# Altium footprint library Intelliclone.PcbLib: 372 footprints (part 18 of 24)
Each footprint in its own frame and in the unit in brackets; x right, y up, seen from the top. Pads: shape width x height; smd on the part's side, far side on the other; paste and mask are expansions set on the pad; w line width, h text height; cw(c..) or ccw(c..) is an arc to the next point about the centre after c.
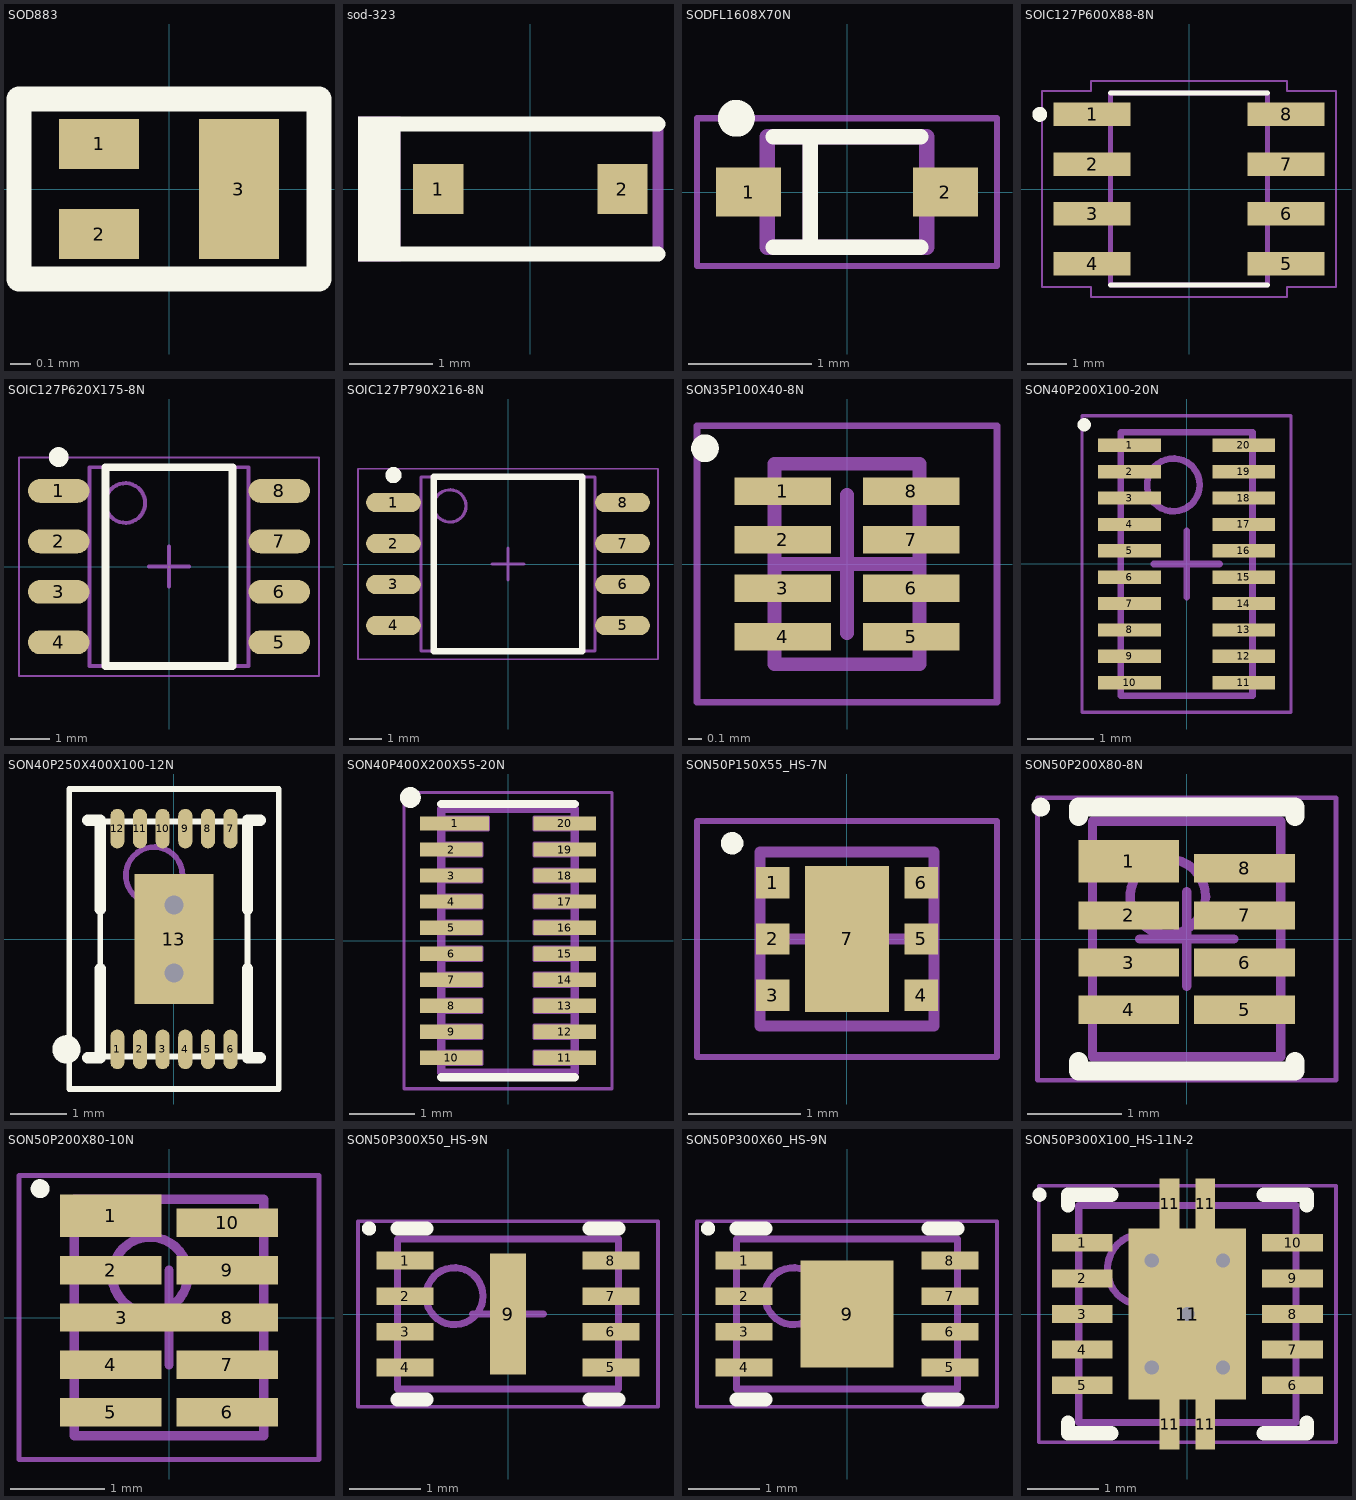
[diagram p17: the footprints below, top view; thin cyan lines are the x and y axes]

## SOD883 [mm]
pads (3):
  rect 0.4x0.25 smd paste+0 mask+0.05: 1(-0.35,0.225) 2(-0.35,-0.225)
  rect 0.4x0.7 smd paste+0 mask+0.05: 3(0.35,0)
Top Overlay:
  lines w0.127: -0.75,-0.45 0.75,-0.45 0.75,0.45 -0.75,0.45 -0.75,-0.45

## sod-323 [mm] "NXP recommended land pattern"
height 1.15
pads (2):
  rect 0.6x0.6 smd paste-0.05: 1(-1.1,0) 2(1.1,0)
Top Overlay:
  rectangle: -2.057,-0.864 -1.549,0.864
  lines w0.178: -1.803,-0.775 0.1,-0.775 1.525,-0.775 ; -1.803,0.775 0.1,0.775 1.525,0.775
Mechanical 5:
  rectangle: -2.057,-0.864 -1.549,0.864
  lines w0.127: -1.803,-0.775 0.1,-0.775 1.525,-0.775 1.525,0.775 0.1,0.775 -1.803,0.775
3D body "SOD-323.stp": height 1.1, standoff 0, extent -1.3,-0.675 1.3,0.675

## SODFL1608X70N [mm]
height 0.7
pads (2):
  rect 0.53x0.4 smd: 1(-0.8,0) 2(0.8,0)
Top Overlay:
  circle w0.2: c-0.9,0.6 r0.05
  lines w0.127: -0.6,-0.45 -0.3,-0.45 ; -0.6,0.45 -0.3,0.45 ; 0.6,-0.45 -0.3,-0.45 ; 0.6,0.45 -0.3,0.45 ; -0.3,-0.45 -0.3,0.45
Mechanical 4:
  lines w0.127: -0.65,-0.45 -0.3,-0.45 ; -0.65,-0.45 -0.65,0.45 ; -0.65,-0.45 -0.3,-0.45 ; -0.65,-0.45 -0.65,0.45 ; -0.65,0.45 -0.3,0.45 ; -0.65,0.45 -0.3,0.45 ; -0.3,-0.45 -0.3,0.45 ; -0.3,-0.45 0.65,-0.45 ; -0.3,-0.45 -0.3,0.45 ; -0.3,-0.45 0.65,-0.45 ; -0.3,0.45 0.65,0.45 ; -0.3,0.45 0.65,0.45 ; 0.65,-0.45 0.65,0.45 ; 0.65,-0.45 0.65,0.45
Mechanical 15:
  lines w0.05: -1.22,-0.6 -1.22,0.6 1.22,0.6 1.22,-0.6 -1.22,-0.6
3D body "User Library-CDSU101A.STEP": height 0.85, standoff 0, extent -0.914,-0.457 0.886,0.543

## SOIC127P600X88-8N [mm]
pads (8):
  rect 1.97x0.6 smd: 1(-2.475,1.905) 2(-2.475,0.635) 3(-2.475,-0.635) 4(-2.475,-1.905) 5(2.475,-1.905) 6(2.475,-0.635) 7(2.475,0.635) 8(2.475,1.905)
Top Overlay:
  circle w0.19: c-3.81,1.905 r0.095
  lines w0.127: -2,-2.45 2,-2.45 ; -2,2.45 2,2.45
Mechanical 4:
  lines w0.127: -2,-2.45 -2,2.45 ; -2,-2.45 2,-2.45 ; -2,-2.45 -2,2.45 ; -2,-2.45 2,-2.45 ; -2,2.45 2,2.45 ; -2,2.45 2,2.45 ; 2,-2.45 2,2.45 ; 2,-2.45 2,2.45
Mechanical 16:
  lines w0.05: -3.75,-2.5 -3.75,2.5 -2.5,2.5 -2.5,2.75 2.5,2.75 2.5,2.5 3.75,2.5 3.75,-2.5 2.5,-2.5 2.5,-2.75 -2.5,-2.75 -2.5,-2.5 -3.75,-2.5

## SOIC127P620X175-8N [mm] "SOIC, 8-Leads, Body 5.00x4.00mm, Pitch 1.27mm, IPC Medium Density"
height 1.75
pads (8):
  oval 1.55x0.6 smd: 1(-2.775,1.905) 2(-2.775,0.635) 3(-2.775,-0.635) 4(-2.775,-1.905) 5(2.775,-1.905) 6(2.775,-0.635) 7(2.775,0.635) 8(2.775,1.905)
Top Overlay:
  circle w0.25: c-2.775,2.755 r0.125
  lines w0.2: -1.6,-2.5 1.6,-2.5 1.6,2.5 -1.6,2.5 -1.6,-2.5
Mechanical 13:
  circle w0.1: c-1.1,1.6 r0.5
  lines w0.1: -2,-2.5 2,-2.5 2,2.5 -2,2.5 -2,-2.5
Mechanical 15:
  lines w0.05: -3.775,-2.75 3.775,-2.75 3.775,2.75 -3.775,2.75 -3.775,-2.75
  lines w0.1: -0.5,0 0.5,0 ; 0,-0.5 0,0.5
3D body "SO-8.STEP": height 1.5, standoff 0, extent -3.014,-2.45 3.014,2.45

## SOIC127P790X216-8N [mm] "SOIC, 8-Leads, Body 5.28x5.28mm, Pitch 1.27mm, IPC Medium Density"
height 2.16
pads (8):
  oval 1.7x0.6 smd: 1(-3.55,1.905) 2(-3.55,0.635) 3(-3.55,-0.635) 4(-3.55,-1.905) 5(3.55,-1.905) 6(3.55,-0.635) 7(3.55,0.635) 8(3.55,1.905)
Top Overlay:
  circle w0.25: c-3.55,2.755 r0.125
  lines w0.2: -2.3,-2.7 -2.3,2.7 2.3,2.7 2.3,-2.7 -2.3,-2.7
Mechanical 13:
  circle w0.1: c-1.8,1.8 r0.5
  lines w0.1: -2.7,-2.7 -2.7,2.7 2.7,2.7 2.7,-2.7 -2.7,-2.7
Mechanical 15:
  lines w0.05: -4.65,-2.95 -4.65,2.95 4.65,2.95 4.65,-2.95 -4.65,-2.95
  lines w0.1: -0.5,0 0.5,0 ; 0,-0.5 0,0.5
3D body "SO-8 208mil.STEP": height 1.5, standoff 0, extent -4.014,-2.642 4.014,2.641

## SON35P100X40-8N [mm] "SON, 8-Leads, Body 1.40x1.00mm, Pitch 0.35mm, IPC Medium Density"
height 0.4
pads (8):
  rect 0.7x0.2 smd: 1(-0.465,0.525) 2(-0.465,0.175) 3(-0.465,-0.175) 4(-0.465,-0.525) 5(0.465,-0.525) 6(0.465,-0.175) 7(0.465,0.175) 8(0.465,0.525)
Top Overlay:
  circle w0.1: c-1.027,0.837 r0.05
Mechanical 13:
  lines w0.1: -0.525,-0.725 0.525,-0.725 0.525,0.725 -0.525,0.725 -0.525,-0.725
Mechanical 15:
  lines w0.05: -1.085,-1 1.085,-1 1.085,1 -1.085,1 -1.085,-1
  lines w0.1: -0.5,0 0.5,0 ; 0,-0.5 0,0.5
3D body: height 0.4, standoff 0.05, extent -0.525,-0.725 0.525,0.725

## SON40P200X100-20N [mm] "SON, 20-Leads, Body 4.00x2.00mm, Pitch 0.40mm, IPC Medium Density"
height 1
pads (20):
  rect 0.95x0.2 smd: 1(-0.865,1.8) 2(-0.865,1.4) 3(-0.865,1) 4(-0.865,0.6) 5(-0.865,0.2) 6(-0.865,-0.2) 7(-0.865,-0.6) 8(-0.865,-1) 9(-0.865,-1.4) 10(-0.865,-1.8) 11(0.865,-1.8) 12(0.865,-1.4) 13(0.865,-1) 14(0.865,-0.6) 15(0.865,-0.2) 16(0.865,0.2) 17(0.865,0.6) 18(0.865,1) 19(0.865,1.4) 20(0.865,1.8)
Top Overlay:
  circle w0.1: c-1.552,2.112 r0.05
Mechanical 13:
  circle w0.1: c-0.2,1.2 r0.4
  lines w0.1: -1,-2 -1,2 1,2 1,-2 -1,-2
Mechanical 15:
  lines w0.05: -1.585,-2.25 -1.585,2.25 1.585,2.25 1.585,-2.25 -1.585,-2.25
  lines w0.1: -0.5,0 0.5,0 ; 0,-0.5 0,0.5
3D body "SON40P200X100-20N.step": height 1, standoff 0, extent -1.08,-2 1.08,2

## SON40P250X400X100-12N [mm] "SON, 12-Leads, Body 4.2x2.6mm (max), Pitch 0.40mm, IPC Medium Density"
height 1
pads (13):
  oval 0.25x0.7 smd: 1(-1,-1.95) 2(-0.6,-1.95) 3(-0.2,-1.95) 4(0.2,-1.95) 5(0.6,-1.95) 6(1,-1.95) 7(1,1.95) 8(0.6,1.95) 9(0.2,1.95) 10(-0.2,1.95) 11(-0.6,1.95) 12(-1,1.95)
  rect 1.4x2.3 smd: 13(0,0)
via 0,-0.6 diameter 0.66 hole 0.33
via 0,0.6 diameter 0.66 hole 0.33
Top Overlay:
  circle w0.25: c-1.9,-1.95 r0.125
  lines w0.1: -0.5,0 0.5,0 ; 0,-0.5 0,0.5 ; -1.85,-2.65 1.85,-2.65 1.85,2.65 -1.85,2.65 -1.85,-2.65 ; -1.3,-2.075 1.3,-2.075 1.3,2.075 -1.3,2.075 -1.3,-2.075
  lines w0.2: -1.525,-2.1 -1.3,-2.1 -1.3,-0.525 ; -1.525,2.1 -1.3,2.1 -1.3,0.525 ; 1.3,-0.525 1.3,-2.1 1.525,-2.1 ; 1.3,0.525 1.3,2.1 1.525,2.1
Mechanical 13:
  circle w0.1: c-0.35,1.125 r0.5
3D body: height 1, standoff 0.01, extent -1.3,-2.075 1.3,2.075

## SON40P400X200X55-20N [mm]
pads (20):
  rect 1.06x0.22 smd: 1(-0.82,1.8)
  rect 0.96x0.22 smd: 2(-0.87,1.4) 3(-0.87,1) 4(-0.87,0.6) 5(-0.87,0.2) 6(-0.87,-0.2) 7(-0.87,-0.6) 8(-0.87,-1) 9(-0.87,-1.4) 10(-0.87,-1.8) 11(0.87,-1.8) 12(0.87,-1.4) 13(0.87,-1) 14(0.87,-0.6) 15(0.87,-0.2) 16(0.87,0.2) 17(0.87,0.6) 18(0.87,1) 19(0.87,1.4) 20(0.87,1.8)
Top Overlay:
  circle w0.16: c-1.5,2.2 r0.08
  lines w0.127: -1.025,-2.1 1.025,-2.1 ; -1.025,2.1 1.025,2.1
Mechanical 4:
  drawing of 208 lines, arcs and shapes, not listed
Mechanical 16:
  lines w0.05: -1.6,-2.275 -1.6,2.275 1.6,2.275 1.6,-2.275 -1.6,-2.275

## SON50P150X55_HS-7N [mm] "SON, 6-Leads, Body 1.50x1.50mm, Pitch 0.50mm, Thermal Pad 1.20x0.65mm, IPC Medium Density"
height 0.55
pads (7):
  rect 0.3x0.28 smd: 1(-0.66,0.5) 2(-0.66,0) 3(-0.66,-0.5) 4(0.66,-0.5) 5(0.66,0) 6(0.66,0.5)
  rect 0.75x1.3 smd: 7(0,0)
Top Overlay:
  circle w0.1: c-1.022,0.852 r0.05
Mechanical 13:
  lines w0.1: -0.775,-0.775 0.775,-0.775 0.775,0.775 -0.775,0.775 -0.775,-0.775
Mechanical 15:
  lines w0.05: -1.335,-1.05 1.335,-1.05 1.335,1.05 -1.335,1.05 -1.335,-1.05
  lines w0.1: -0.5,0 0.5,0 ; 0,-0.5 0,0.5
3D body: height 0.55, standoff 0.05, extent -0.775,-0.775 0.775,0.775

## SON50P200X80-8N [mm] "SON, 8-Leads, Body 2.50x2.00mm, Pitch 0.50mm, IPC Medium Density"
height 0.8
pads (8):
  rect 1.07x0.45 smd: 1(-0.615,0.825)
  rect 1.07x0.3 smd: 2(-0.615,0.25) 3(-0.615,-0.25) 4(-0.615,-0.75) 5(0.615,-0.75) 6(0.615,-0.25) 7(0.615,0.25) 8(0.615,0.75)
Top Overlay:
  circle w0.1: c-1.55,1.4 r0.05
  lines w0.2: -1.15,-1.3 -1.15,-1.4 1.15,-1.4 1.15,-1.3 ; -1.15,1.3 -1.15,1.4 1.15,1.4 1.15,1.3
Mechanical 13:
  circle w0.1: c-0.2,0.45 r0.4
  lines w0.1: -1,-1.25 1,-1.25 1,1.25 -1,1.25 -1,-1.25
Mechanical 15:
  lines w0.05: -1.585,-1.5 1.585,-1.5 1.585,1.5 -1.585,1.5 -1.585,-1.5
  lines w0.1: -0.5,0 0.5,0 ; 0,-0.5 0,0.5
3D body: height 0.8, standoff 0.05, extent -1,-1.25 1,1.25

## SON50P200X80-10N [mm] "SON, 10-Leads, Body 2.50x2.00mm, Pitch 0.50mm, IPC Medium Density"
height 0.8
pads (10):
  rect 1.07x0.45 smd: 1(-0.615,1.075)
  rect 1.07x0.3 smd: 2(-0.615,0.5) 4(-0.615,-0.5) 5(-0.615,-1) 6(0.615,-1) 7(0.615,-0.5) 8(0.615,0) 9(0.615,0.5) 10(0.615,1)
  rect 1.3x0.3 smd: 3(-0.5,0)
Top Overlay:
  circle w0.1: c-1.362,1.362 r0.05
Mechanical 13:
  circle w0.1: c-0.2,0.45 r0.4
  lines w0.1: -1,-1.25 1,-1.25 1,1.25 -1,1.25 -1,-1.25
Mechanical 15:
  lines w0.05: -1.585,-1.5 1.585,-1.5 1.585,1.5 -1.585,1.5 -1.585,-1.5
  lines w0.1: -0.5,0 0.5,0 ; 0,-0.5 0,0.5
3D body: height 0.8, standoff 0.05, extent -1,-1.25 1,1.25

## SON50P300X50_HS-9N [mm] "SON, 8-Leads, Body 2.00x3.00mm, Pitch 0.50mm, Thermal Pad 1.90x0.5mm, IPC Medium Density"
height 0.6
pads (9):
  rect 0.8x0.25 smd: 1(-1.445,0.75) 2(-1.445,0.25) 3(-1.445,-0.25) 4(-1.445,-0.75) 5(1.445,-0.75) 6(1.445,-0.25) 7(1.445,0.25) 8(1.445,0.75)
  rect 0.5x1.7 smd: 9(0,0)
Top Overlay:
  circle w0.1: c-1.95,1.2 r0.05
  lines w0.2: -1.55,-1.2 -1.145,-1.2 ; -1.55,1.2 -1.145,1.2 ; 1.145,-1.2 1.55,-1.2 ; 1.145,1.2 1.55,1.2
Mechanical 13:
  circle w0.1: c-0.75,0.25 r0.4
  lines w0.1: -1.55,-1.05 1.55,-1.05 1.55,1.05 -1.55,1.05 -1.55,-1.05
Mechanical 15:
  lines w0.05: -2.105,-1.3 2.105,-1.3 2.105,1.3 -2.105,1.3 -2.105,-1.3
  lines w0.1: -0.5,0 0.5,0 ; 0,-0.5 0,0.5
3D body: height 0.6, standoff 0.05, extent -1.55,-1.05 1.55,1.05

## SON50P300X60_HS-9N [mm] "SON, 8-Leads, Body 2.00x3.00mm, Pitch 0.50mm, Thermal Pad 1.50x1.30mm, IPC Medium Density"
height 0.6
pads (9):
  rect 0.8x0.25 smd: 1(-1.445,0.75) 2(-1.445,0.25) 3(-1.445,-0.25) 4(-1.445,-0.75) 5(1.445,-0.75) 6(1.445,-0.25) 7(1.445,0.25) 8(1.445,0.75)
  rect 1.3x1.5 smd: 9(0,0)
Top Overlay:
  circle w0.1: c-1.95,1.2 r0.05
  lines w0.2: -1.55,-1.2 -1.145,-1.2 ; -1.55,1.2 -1.145,1.2 ; 1.145,-1.2 1.55,-1.2 ; 1.145,1.2 1.55,1.2
Mechanical 13:
  circle w0.1: c-0.75,0.25 r0.4
  lines w0.1: -1.55,-1.05 1.55,-1.05 1.55,1.05 -1.55,1.05 -1.55,-1.05
Mechanical 15:
  lines w0.05: -2.105,-1.3 2.105,-1.3 2.105,1.3 -2.105,1.3 -2.105,-1.3
  lines w0.1: -0.5,0 0.5,0 ; 0,-0.5 0,0.5
3D body: height 0.6, standoff 0.05, extent -1.55,-1.05 1.55,1.05

## SON50P300X100_HS-11N-2 [mm] "SON, 10-Leads, Body 3.00x3.00mm, Pitch 0.50mm, Thermal Pad 1.65x1.54mm, IPC Medium Density"
height 1
pads (15):
  rect 0.85x0.25 smd: 1(-1.475,1) 2(-1.475,0.5) 3(-1.475,0) 4(-1.475,-0.5) 5(-1.475,-1) 6(1.475,-1) 7(1.475,-0.5) 8(1.475,0) 9(1.475,0.5) 10(1.475,1)
  rect 0.28x0.7 smd: 11(-0.25,-1.55) 11(-0.25,1.55) 11(0.25,-1.55) 11(0.25,1.55)
  rect 1.65x2.4 smd: 11(0,0)
via -0.5,0.75 diameter 0.5 hole 0.2
via 0.5,0.75 diameter 0.5 hole 0.2
via -0.5,-0.75 diameter 0.5 hole 0.2
via 0.5,-0.75 diameter 0.5 hole 0.2
via 0,0 diameter 0.5 hole 0.2
Top Overlay:
  circle w0.1: c-2.075,1.675 r0.05
  lines w0.2: -1.675,-1.525 -1.675,-1.675 -1.07,-1.675 ; -1.675,1.525 -1.675,1.675 -1.07,1.675 ; 1.07,-1.675 1.675,-1.675 1.675,-1.525 ; 1.07,1.675 1.675,1.675 1.675,1.525
Mechanical 13:
  circle w0.1: c-0.625,0.625 r0.5
  lines w0.1: -1.525,-1.525 -1.525,1.525 1.525,1.525 1.525,-1.525 -1.525,-1.525
Mechanical 15:
  lines w0.05: -2.085,-1.8 -2.085,1.8 2.085,1.8 2.085,-1.8 -2.085,-1.8
  lines w0.1: -0.5,0 0.5,0 ; 0,-0.5 0,0.5
3D body: height 1, standoff 0.05, extent -1.525,-1.525 1.525,1.525